# Altium integrated library Samtec_2_mm_Pitch_Socket_Strips.IntLib: 251 symbols (part 1 of 3) (continued)
## MMS-111-02-L-DV-A
designator J?
Tiger Claw(TM) Socket Strip, Surface Mount, Vertical, -55 to 125 degC, 2 mm Pitch, 22-Pin, Female, RoHS; Manufacturer: Samtec; PartNumber: MMS-111-02-L-DV-A; Pitch: 2 mm; DatasheetVersion: F-214; PackageVersion: CI, 4/1994; PackageReference: MMS-111-02-X-DV-A; PackageDescription: 2mm Surface Mount Box Connector Strip ASM; Orientation: Vertical; RoHS: True; Temperature Range: -55 to 125 degC; Mounting Technology: Surface Mount; ComponentLink1Description: Manufacturer URL; ComponentLink1URL: http://www.samtec.com; ComponentLink2Description: Datasheet; ComponentLink2URL: http://www.samtec.com/documents/webfiles/pdf/MMS.PDF; ComponentLink3Description: Package Specification; ComponentLink3URL: http://www.samtec.com/documents/webfiles/cpdf/MMS-1XX-02-XXX-XX-XX-XXX-MKT.pdf
footprint SMTC-MMS-111-02-X-DV-A (Surface Mount Box Connector Strip ASM, 2x11 Pins, Vertical, 2mm Pitch, Female)
pins: 1, 2, 3, 4, 5, 6, 7, 8, 9, 10, 11, 12, 13, 14, 15, 16, 17, 18, 19, 20, 21, 22

## MMS-111-02-L-DV-LC
designator J?
Tiger Claw(TM) Socket Strip, Surface Mount, Vertical, -55 to 125 degC, 2 mm Pitch, 22-Pin, Female, RoHS; Manufacturer: Samtec; PartNumber: MMS-111-02-L-DV-LC; Pitch: 2 mm; DatasheetVersion: F-214; PackageVersion: CI, 4/1994; PackageReference: MMS-111-02-X-DV-LC; PackageDescription: 2mm Surface Mount Box Connector Strip ASM; Orientation: Vertical; RoHS: True; Temperature Range: -55 to 125 degC; Mounting Technology: Surface Mount; ComponentLink1Description: Manufacturer URL; ComponentLink1URL: http://www.samtec.com; ComponentLink2Description: Datasheet; ComponentLink2URL: http://www.samtec.com/documents/webfiles/pdf/MMS.PDF; ComponentLink3Description: Package Specification; ComponentLink3URL: http://www.samtec.com/documents/webfiles/cpdf/MMS-1XX-02-XXX-XX-XX-XXX-MKT.pdf
footprint SMTC-MMS-111-02-X-DV-LC (Surface Mount Box Connector Strip ASM, 2x11 Pins, Vertical, 2mm Pitch, Female)
pins: 1, 2, 3, 4, 5, 6, 7, 8, 9, 10, 11, 12, 13, 14, 15, 16, 17, 18, 19, 20, 21, 22

## MMS-111-02-T-DV-A
designator J?
Tiger Claw(TM) Socket Strip, Surface Mount, Vertical, -55 to 105 degC, 2 mm Pitch, 22-Pin, Female, RoHS; Manufacturer: Samtec; PartNumber: MMS-111-02-T-DV-A; Pitch: 2 mm; DatasheetVersion: F-214; PackageVersion: CI, 4/1994; PackageReference: MMS-111-02-X-DV-A; PackageDescription: 2mm Surface Mount Box Connector Strip ASM; Orientation: Vertical; RoHS: True; Temperature Range: -55 to 105 degC; Mounting Technology: Surface Mount; ComponentLink1Description: Manufacturer URL; ComponentLink1URL: http://www.samtec.com; ComponentLink2Description: Datasheet; ComponentLink2URL: http://www.samtec.com/documents/webfiles/pdf/MMS.PDF; ComponentLink3Description: Package Specification; ComponentLink3URL: http://www.samtec.com/documents/webfiles/cpdf/MMS-1XX-02-XXX-XX-XX-XXX-MKT.pdf
footprint SMTC-MMS-111-02-X-DV-A (Surface Mount Box Connector Strip ASM, 2x11 Pins, Vertical, 2mm Pitch, Female)
pins: 1, 2, 3, 4, 5, 6, 7, 8, 9, 10, 11, 12, 13, 14, 15, 16, 17, 18, 19, 20, 21, 22

## MMS-111-02-T-DV-LC
designator J?
Tiger Claw(TM) Socket Strip, Surface Mount, Vertical, -55 to 105 degC, 2 mm Pitch, 22-Pin, Female, RoHS; Manufacturer: Samtec; PartNumber: MMS-111-02-T-DV-LC; Pitch: 2 mm; DatasheetVersion: F-214; PackageVersion: CI, 4/1994; PackageReference: MMS-111-02-X-DV-LC; PackageDescription: 2mm Surface Mount Box Connector Strip ASM; Orientation: Vertical; RoHS: True; Temperature Range: -55 to 105 degC; Mounting Technology: Surface Mount; ComponentLink1Description: Manufacturer URL; ComponentLink1URL: http://www.samtec.com; ComponentLink2Description: Datasheet; ComponentLink2URL: http://www.samtec.com/documents/webfiles/pdf/MMS.PDF; ComponentLink3Description: Package Specification; ComponentLink3URL: http://www.samtec.com/documents/webfiles/cpdf/MMS-1XX-02-XXX-XX-XX-XXX-MKT.pdf
footprint SMTC-MMS-111-02-X-DV-LC (Surface Mount Box Connector Strip ASM, 2x11 Pins, Vertical, 2mm Pitch, Female)
pins: 1, 2, 3, 4, 5, 6, 7, 8, 9, 10, 11, 12, 13, 14, 15, 16, 17, 18, 19, 20, 21, 22

## MMS-112-02-F-DV-K
designator J?
Tiger Claw(TM) Socket Strip, Surface Mount, Vertical, -55 to 125 degC, 2 mm Pitch, 24-Pin, Female, RoHS; Manufacturer: Samtec; PartNumber: MMS-112-02-F-DV-K; Pitch: 2 mm; DatasheetVersion: F-214; PackageVersion: CI, 4/1994; PackageReference: MMS-112-02-X-DV-K; PackageDescription: 2mm Surface Mount Box Connector Strip ASM; Orientation: Vertical; RoHS: True; Temperature Range: -55 to 125 degC; Mounting Technology: Surface Mount; ComponentLink1Description: Manufacturer URL; ComponentLink1URL: http://www.samtec.com; ComponentLink2Description: Datasheet; ComponentLink2URL: http://www.samtec.com/documents/webfiles/pdf/MMS.PDF; ComponentLink3Description: Package Specification; ComponentLink3URL: http://www.samtec.com/documents/webfiles/cpdf/MMS-1XX-02-XXX-XX-XX-XXX-MKT.pdf
footprint SMTC-MMS-112-02-X-DV-K (Surface Mount Box Connector Strip ASM, 2x12 Pins, Vertical, 2mm Pitch, Female)
pins: 1, 2, 3, 4, 5, 6, 7, 8, 9, 10, 11, 12, 13, 14, 15, 16, 17, 18, 19, 20, 21, 22, 23, 24

## MMS-112-02-L-DV-K
designator J?
Tiger Claw(TM) Socket Strip, Surface Mount, Vertical, -55 to 125 degC, 2 mm Pitch, 24-Pin, Female, RoHS; Manufacturer: Samtec; PartNumber: MMS-112-02-L-DV-K; Pitch: 2 mm; DatasheetVersion: F-214; PackageVersion: CI, 4/1994; PackageReference: MMS-112-02-X-DV-K; PackageDescription: 2mm Surface Mount Box Connector Strip ASM; Orientation: Vertical; RoHS: True; Temperature Range: -55 to 125 degC; Mounting Technology: Surface Mount; ComponentLink1Description: Manufacturer URL; ComponentLink1URL: http://www.samtec.com; ComponentLink2Description: Datasheet; ComponentLink2URL: http://www.samtec.com/documents/webfiles/pdf/MMS.PDF; ComponentLink3Description: Package Specification; ComponentLink3URL: http://www.samtec.com/documents/webfiles/cpdf/MMS-1XX-02-XXX-XX-XX-XXX-MKT.pdf
footprint SMTC-MMS-112-02-X-DV-K (Surface Mount Box Connector Strip ASM, 2x12 Pins, Vertical, 2mm Pitch, Female)
pins: 1, 2, 3, 4, 5, 6, 7, 8, 9, 10, 11, 12, 13, 14, 15, 16, 17, 18, 19, 20, 21, 22, 23, 24

## MMS-112-02-T-DV-K
designator J?
Tiger Claw(TM) Socket Strip, Surface Mount, Vertical, -55 to 105 degC, 2 mm Pitch, 24-Pin, Female, RoHS; Manufacturer: Samtec; PartNumber: MMS-112-02-T-DV-K; Pitch: 2 mm; DatasheetVersion: F-214; PackageVersion: CI, 4/1994; PackageReference: MMS-112-02-X-DV-K; PackageDescription: 2mm Surface Mount Box Connector Strip ASM; Orientation: Vertical; RoHS: True; Temperature Range: -55 to 105 degC; Mounting Technology: Surface Mount; ComponentLink1Description: Manufacturer URL; ComponentLink1URL: http://www.samtec.com; ComponentLink2Description: Datasheet; ComponentLink2URL: http://www.samtec.com/documents/webfiles/pdf/MMS.PDF; ComponentLink3Description: Package Specification; ComponentLink3URL: http://www.samtec.com/documents/webfiles/cpdf/MMS-1XX-02-XXX-XX-XX-XXX-MKT.pdf
footprint SMTC-MMS-112-02-X-DV-K (Surface Mount Box Connector Strip ASM, 2x12 Pins, Vertical, 2mm Pitch, Female)
pins: 1, 2, 3, 4, 5, 6, 7, 8, 9, 10, 11, 12, 13, 14, 15, 16, 17, 18, 19, 20, 21, 22, 23, 24

## MMS-114-01-F-DV-01
designator J?
Tiger Claw(TM) Socket Strip, Through-hole, Vertical, -55 to 125 degC, 2 mm Pitch, 28-Pin, Female, RoHS; Manufacturer: Samtec; PartNumber: MMS-114-01-F-DV-01; Pitch: 2 mm; DatasheetVersion: F-214; PackageVersion: AO, 2/1993; PackageReference: MMS-114-01-X-DV-01; PackageDescription: 2mm Through Hole Box Connector Strip Assembly; Orientation: Vertical; RoHS: True; Temperature Range: -55 to 125 degC; Mounting Technology: Through-hole; ComponentLink1Description: Manufacturer URL; ComponentLink1URL: http://www.samtec.com; ComponentLink2Description: Datasheet; ComponentLink2URL: http://www.samtec.com/documents/webfiles/pdf/MMS.PDF; ComponentLink3Description: Package Specification; ComponentLink3URL: http://www.samtec.com/documents/webfiles/cpdf/MMS-1XX-01-XXX-XX-XXX-MKT1.pdf
footprint SMTC-MMS-114-01-X-DV-01 (Through Hole Box Connector Strip Assembly, 2x14 Pins, Vertical, 2mm Pitch, Female)
pins: 1, 2, 3, 4, 5, 6, 7, 8, 9, 10, 11, 12, 13, 14, 15, 16, 17, 18, 19, 20, 21, 22, 23, 24, 25, 26, 27, 28

## MMS-114-01-L-DV-01
designator J?
Tiger Claw(TM) Socket Strip, Through-hole, Vertical, -55 to 125 degC, 2 mm Pitch, 28-Pin, Female, RoHS; Manufacturer: Samtec; PartNumber: MMS-114-01-L-DV-01; Pitch: 2 mm; DatasheetVersion: F-214; PackageVersion: AO, 2/1993; PackageReference: MMS-114-01-X-DV-01; PackageDescription: 2mm Through Hole Box Connector Strip Assembly; Orientation: Vertical; RoHS: True; Temperature Range: -55 to 125 degC; Mounting Technology: Through-hole; ComponentLink1Description: Manufacturer URL; ComponentLink1URL: http://www.samtec.com; ComponentLink2Description: Datasheet; ComponentLink2URL: http://www.samtec.com/documents/webfiles/pdf/MMS.PDF; ComponentLink3Description: Package Specification; ComponentLink3URL: http://www.samtec.com/documents/webfiles/cpdf/MMS-1XX-01-XXX-XX-XXX-MKT1.pdf
footprint SMTC-MMS-114-01-X-DV-01 (Through Hole Box Connector Strip Assembly, 2x14 Pins, Vertical, 2mm Pitch, Female)
pins: 1, 2, 3, 4, 5, 6, 7, 8, 9, 10, 11, 12, 13, 14, 15, 16, 17, 18, 19, 20, 21, 22, 23, 24, 25, 26, 27, 28

## MMS-114-01-T-DV-01
designator J?
Tiger Claw(TM) Socket Strip, Through-hole, Vertical, -55 to 105 degC, 2 mm Pitch, 28-Pin, Female, RoHS; Manufacturer: Samtec; PartNumber: MMS-114-01-T-DV-01; Pitch: 2 mm; DatasheetVersion: F-214; PackageVersion: AO, 2/1993; PackageReference: MMS-114-01-X-DV-01; PackageDescription: 2mm Through Hole Box Connector Strip Assembly; Orientation: Vertical; RoHS: True; Temperature Range: -55 to 105 degC; Mounting Technology: Through-hole; ComponentLink1Description: Manufacturer URL; ComponentLink1URL: http://www.samtec.com; ComponentLink2Description: Datasheet; ComponentLink2URL: http://www.samtec.com/documents/webfiles/pdf/MMS.PDF; ComponentLink3Description: Package Specification; ComponentLink3URL: http://www.samtec.com/documents/webfiles/cpdf/MMS-1XX-01-XXX-XX-XXX-MKT1.pdf
footprint SMTC-MMS-114-01-X-DV-01 (Through Hole Box Connector Strip Assembly, 2x14 Pins, Vertical, 2mm Pitch, Female)
pins: 1, 2, 3, 4, 5, 6, 7, 8, 9, 10, 11, 12, 13, 14, 15, 16, 17, 18, 19, 20, 21, 22, 23, 24, 25, 26, 27, 28

## MMS-120-02-F-DV-K
designator J?
Tiger Claw(TM) Socket Strip, Surface Mount, Vertical, -55 to 125 degC, 2 mm Pitch, 40-Pin, Female, RoHS; Manufacturer: Samtec; PartNumber: MMS-120-02-F-DV-K; Pitch: 2 mm; DatasheetVersion: F-214; PackageVersion: CI, 4/1994; PackageReference: MMS-120-02-X-DV-K; PackageDescription: 2mm Surface Mount Box Connector Strip ASM; Orientation: Vertical; RoHS: True; Temperature Range: -55 to 125 degC; Mounting Technology: Surface Mount; ComponentLink1Description: Manufacturer URL; ComponentLink1URL: http://www.samtec.com; ComponentLink2Description: Datasheet; ComponentLink2URL: http://www.samtec.com/documents/webfiles/pdf/MMS.PDF; ComponentLink3Description: Package Specification; ComponentLink3URL: http://www.samtec.com/documents/webfiles/cpdf/MMS-1XX-02-XXX-XX-XX-XXX-MKT.pdf
footprint SMTC-MMS-120-02-X-DV-K (Surface Mount Box Connector Strip ASM, 2x20 Pins, Vertical, 2mm Pitch, Female)
pins: 1, 2, 3, 4, 5, 6, 7, 8, 9, 10, 11, 12, 13, 14, 15, 16, 17, 18, 19, 20, 21, 22, 23, 24, 25, 26, 27, 28, 29, 30, 31, 32, 33, 34, 35, 36, 37, 38, 39, 40

## MMS-120-02-F-DV-P
designator J?
Tiger Claw(TM) Socket Strip, Surface Mount, Vertical, -55 to 125 degC, 2 mm Pitch, 40-Pin, Female, RoHS; Manufacturer: Samtec; PartNumber: MMS-120-02-F-DV-P; Pitch: 2 mm; DatasheetVersion: F-214; PackageVersion: CI, 4/1994; PackageReference: MMS-120-02-X-DV-P; PackageDescription: 2mm Surface Mount Box Connector Strip ASM; Orientation: Vertical; RoHS: True; Temperature Range: -55 to 125 degC; Mounting Technology: Surface Mount; ComponentLink1Description: Manufacturer URL; ComponentLink1URL: http://www.samtec.com; ComponentLink2Description: Datasheet; ComponentLink2URL: http://www.samtec.com/documents/webfiles/pdf/MMS.PDF; ComponentLink3Description: Package Specification; ComponentLink3URL: http://www.samtec.com/documents/webfiles/cpdf/MMS-1XX-02-XXX-XX-XX-XXX-MKT.pdf
footprint SMTC-MMS-120-02-X-DV-P (Surface Mount Box Connector Strip ASM, 2x20 Pins, Vertical, 2mm Pitch, Female)
pins: 1, 2, 3, 4, 5, 6, 7, 8, 9, 10, 11, 12, 13, 14, 15, 16, 17, 18, 19, 20, 21, 22, 23, 24, 25, 26, 27, 28, 29, 30, 31, 32, 33, 34, 35, 36, 37, 38, 39, 40

## MMS-120-02-F-SH
designator J?
Tiger Claw(TM) Socket Strip, Surface Mount, Horizontal, -55 to 125 degC, 2 mm Pitch, 40-Pin, Female, RoHS; Manufacturer: Samtec; PartNumber: MMS-120-02-F-SH; Pitch: 2 mm; DatasheetVersion: F-214; PackageVersion: CI, 4/1994; PackageReference: MMS-120-02-X-SH; PackageDescription: 2mm Surface Mount Box Connector Strip ASM; Orientation: Horizontal; RoHS: True; Temperature Range: -55 to 125 degC; Mounting Technology: Surface Mount; ComponentLink1Description: Manufacturer URL; ComponentLink1URL: http://www.samtec.com; ComponentLink2Description: Datasheet; ComponentLink2URL: http://www.samtec.com/documents/webfiles/pdf/MMS.PDF; ComponentLink3Description: Package Specification; ComponentLink3URL: http://www.samtec.com/documents/webfiles/cpdf/MMS-1XX-02-XXX-XX-XX-XXX-MKT.pdf
footprint SMTC-MMS-120-02-X-SH (Surface Mount Box Connector Strip ASM, 2x20 Pins, Horizontal, 2mm Pitch, Female)
pins: 1A, 1B, 2A, 2B, 3A, 3B, 4A, 4B, 5A, 5B, 6A, 6B, 7A, 7B, 8A, 8B, 9A, 9B, 10A, 10B, 11A, 11B, 12A, 12B, 13A, 13B, 14A, 14B, 15A, 15B, 16A, 16B, 17A, 17B, 18A, 18B, 19A, 19B, 20A, 20B

## MMS-120-02-L-DV-K
designator J?
Tiger Claw(TM) Socket Strip, Surface Mount, Vertical, -55 to 125 degC, 2 mm Pitch, 40-Pin, Female, RoHS; Manufacturer: Samtec; PartNumber: MMS-120-02-L-DV-K; Pitch: 2 mm; DatasheetVersion: F-214; PackageVersion: CI, 4/1994; PackageReference: MMS-120-02-X-DV-K; PackageDescription: 2mm Surface Mount Box Connector Strip ASM; Orientation: Vertical; RoHS: True; Temperature Range: -55 to 125 degC; Mounting Technology: Surface Mount; ComponentLink1Description: Manufacturer URL; ComponentLink1URL: http://www.samtec.com; ComponentLink2Description: Datasheet; ComponentLink2URL: http://www.samtec.com/documents/webfiles/pdf/MMS.PDF; ComponentLink3Description: Package Specification; ComponentLink3URL: http://www.samtec.com/documents/webfiles/cpdf/MMS-1XX-02-XXX-XX-XX-XXX-MKT.pdf
footprint SMTC-MMS-120-02-X-DV-K (Surface Mount Box Connector Strip ASM, 2x20 Pins, Vertical, 2mm Pitch, Female)
pins: 1, 2, 3, 4, 5, 6, 7, 8, 9, 10, 11, 12, 13, 14, 15, 16, 17, 18, 19, 20, 21, 22, 23, 24, 25, 26, 27, 28, 29, 30, 31, 32, 33, 34, 35, 36, 37, 38, 39, 40

## MMS-120-02-L-DV-P
designator J?
Tiger Claw(TM) Socket Strip, Surface Mount, Vertical, -55 to 125 degC, 2 mm Pitch, 40-Pin, Female, RoHS; Manufacturer: Samtec; PartNumber: MMS-120-02-L-DV-P; Pitch: 2 mm; DatasheetVersion: F-214; PackageVersion: CI, 4/1994; PackageReference: MMS-120-02-X-DV-P; PackageDescription: 2mm Surface Mount Box Connector Strip ASM; Orientation: Vertical; RoHS: True; Temperature Range: -55 to 125 degC; Mounting Technology: Surface Mount; ComponentLink1Description: Manufacturer URL; ComponentLink1URL: http://www.samtec.com; ComponentLink2Description: Datasheet; ComponentLink2URL: http://www.samtec.com/documents/webfiles/pdf/MMS.PDF; ComponentLink3Description: Package Specification; ComponentLink3URL: http://www.samtec.com/documents/webfiles/cpdf/MMS-1XX-02-XXX-XX-XX-XXX-MKT.pdf
footprint SMTC-MMS-120-02-X-DV-P (Surface Mount Box Connector Strip ASM, 2x20 Pins, Vertical, 2mm Pitch, Female)
pins: 1, 2, 3, 4, 5, 6, 7, 8, 9, 10, 11, 12, 13, 14, 15, 16, 17, 18, 19, 20, 21, 22, 23, 24, 25, 26, 27, 28, 29, 30, 31, 32, 33, 34, 35, 36, 37, 38, 39, 40

## MMS-120-02-L-SH
designator J?
Tiger Claw(TM) Socket Strip, Surface Mount, Horizontal, -55 to 125 degC, 2 mm Pitch, 40-Pin, Female, RoHS; Manufacturer: Samtec; PartNumber: MMS-120-02-L-SH; Pitch: 2 mm; DatasheetVersion: F-214; PackageVersion: CI, 4/1994; PackageReference: MMS-120-02-X-SH; PackageDescription: 2mm Surface Mount Box Connector Strip ASM; Supplier 1: Digi-Key; Supplier Part Number 1: SAM1237-20-ND; Supplier 2: Newark; Supplier Part Number 2: 11P5552; Orientation: Horizontal; RoHS: True; Temperature Range: -55 to 125 degC; Mounting Technology: Surface Mount; ComponentLink1Description: Manufacturer URL; ComponentLink1URL: http://www.samtec.com; ComponentLink2Description: Datasheet; ComponentLink2URL: http://www.samtec.com/documents/webfiles/pdf/MMS.PDF; ComponentLink3Description: Package Specification; ComponentLink3URL: http://www.samtec.com/documents/webfiles/cpdf/MMS-1XX-02-XXX-XX-XX-XXX-MKT.pdf
footprint SMTC-MMS-120-02-X-SH (Surface Mount Box Connector Strip ASM, 2x20 Pins, Horizontal, 2mm Pitch, Female)
pins: 1A, 1B, 2A, 2B, 3A, 3B, 4A, 4B, 5A, 5B, 6A, 6B, 7A, 7B, 8A, 8B, 9A, 9B, 10A, 10B, 11A, 11B, 12A, 12B, 13A, 13B, 14A, 14B, 15A, 15B, 16A, 16B, 17A, 17B, 18A, 18B, 19A, 19B, 20A, 20B

## MMS-120-02-T-DV-K
designator J?
Tiger Claw(TM) Socket Strip, Surface Mount, Vertical, -55 to 105 degC, 2 mm Pitch, 40-Pin, Female, RoHS; Manufacturer: Samtec; PartNumber: MMS-120-02-T-DV-K; Pitch: 2 mm; DatasheetVersion: F-214; PackageVersion: CI, 4/1994; PackageReference: MMS-120-02-X-DV-K; PackageDescription: 2mm Surface Mount Box Connector Strip ASM; Orientation: Vertical; RoHS: True; Temperature Range: -55 to 105 degC; Mounting Technology: Surface Mount; ComponentLink1Description: Manufacturer URL; ComponentLink1URL: http://www.samtec.com; ComponentLink2Description: Datasheet; ComponentLink2URL: http://www.samtec.com/documents/webfiles/pdf/MMS.PDF; ComponentLink3Description: Package Specification; ComponentLink3URL: http://www.samtec.com/documents/webfiles/cpdf/MMS-1XX-02-XXX-XX-XX-XXX-MKT.pdf
footprint SMTC-MMS-120-02-X-DV-K (Surface Mount Box Connector Strip ASM, 2x20 Pins, Vertical, 2mm Pitch, Female)
pins: 1, 2, 3, 4, 5, 6, 7, 8, 9, 10, 11, 12, 13, 14, 15, 16, 17, 18, 19, 20, 21, 22, 23, 24, 25, 26, 27, 28, 29, 30, 31, 32, 33, 34, 35, 36, 37, 38, 39, 40

## MMS-120-02-T-DV-P
designator J?
Tiger Claw(TM) Socket Strip, Surface Mount, Vertical, -55 to 105 degC, 2 mm Pitch, 40-Pin, Female, RoHS; Manufacturer: Samtec; PartNumber: MMS-120-02-T-DV-P; Pitch: 2 mm; DatasheetVersion: F-214; PackageVersion: CI, 4/1994; PackageReference: MMS-120-02-X-DV-P; PackageDescription: 2mm Surface Mount Box Connector Strip ASM; Orientation: Vertical; RoHS: True; Temperature Range: -55 to 105 degC; Mounting Technology: Surface Mount; ComponentLink1Description: Manufacturer URL; ComponentLink1URL: http://www.samtec.com; ComponentLink2Description: Datasheet; ComponentLink2URL: http://www.samtec.com/documents/webfiles/pdf/MMS.PDF; ComponentLink3Description: Package Specification; ComponentLink3URL: http://www.samtec.com/documents/webfiles/cpdf/MMS-1XX-02-XXX-XX-XX-XXX-MKT.pdf
footprint SMTC-MMS-120-02-X-DV-P (Surface Mount Box Connector Strip ASM, 2x20 Pins, Vertical, 2mm Pitch, Female)
pins: 1, 2, 3, 4, 5, 6, 7, 8, 9, 10, 11, 12, 13, 14, 15, 16, 17, 18, 19, 20, 21, 22, 23, 24, 25, 26, 27, 28, 29, 30, 31, 32, 33, 34, 35, 36, 37, 38, 39, 40

## MMS-120-02-T-SH
designator J?
Tiger Claw(TM) Socket Strip, Surface Mount, Horizontal, -55 to 105 degC, 2 mm Pitch, 40-Pin, Female, RoHS; Manufacturer: Samtec; PartNumber: MMS-120-02-T-SH; Pitch: 2 mm; DatasheetVersion: F-214; PackageVersion: CI, 4/1994; PackageReference: MMS-120-02-X-SH; PackageDescription: 2mm Surface Mount Box Connector Strip ASM; Supplier 1: Digi-Key; Supplier Part Number 1: SAM1241-20-ND; Orientation: Horizontal; RoHS: True; Temperature Range: -55 to 105 degC; Mounting Technology: Surface Mount; ComponentLink1Description: Manufacturer URL; ComponentLink1URL: http://www.samtec.com; ComponentLink2Description: Datasheet; ComponentLink2URL: http://www.samtec.com/documents/webfiles/pdf/MMS.PDF; ComponentLink3Description: Package Specification; ComponentLink3URL: http://www.samtec.com/documents/webfiles/cpdf/MMS-1XX-02-XXX-XX-XX-XXX-MKT.pdf
footprint SMTC-MMS-120-02-X-SH (Surface Mount Box Connector Strip ASM, 2x20 Pins, Horizontal, 2mm Pitch, Female)
pins: 1A, 1B, 2A, 2B, 3A, 3B, 4A, 4B, 5A, 5B, 6A, 6B, 7A, 7B, 8A, 8B, 9A, 9B, 10A, 10B, 11A, 11B, 12A, 12B, 13A, 13B, 14A, 14B, 15A, 15B, 16A, 16B, 17A, 17B, 18A, 18B, 19A, 19B, 20A, 20B

## MMS-130-02-F-DV-A
designator J?
Tiger Claw(TM) Socket Strip, Surface Mount, Vertical, -55 to 125 degC, 2 mm Pitch, 60-Pin, Female, RoHS; Manufacturer: Samtec; PartNumber: MMS-130-02-F-DV-A; Pitch: 2 mm; DatasheetVersion: F-214; PackageVersion: CI, 4/1994; PackageReference: MMS-130-02-X-DV-A; PackageDescription: 2mm Surface Mount Box Connector Strip ASM; Orientation: Vertical; RoHS: True; Temperature Range: -55 to 125 degC; Mounting Technology: Surface Mount; ComponentLink1Description: Manufacturer URL; ComponentLink1URL: http://www.samtec.com; ComponentLink2Description: Datasheet; ComponentLink2URL: http://www.samtec.com/documents/webfiles/pdf/MMS.PDF; ComponentLink3Description: Package Specification; ComponentLink3URL: http://www.samtec.com/documents/webfiles/cpdf/MMS-1XX-02-XXX-XX-XX-XXX-MKT.pdf
footprint SMTC-MMS-130-02-X-DV-A (Surface Mount Box Connector Strip ASM, 2x30 Pins, Vertical, 2mm Pitch, Female)
pins: 1, 2, 3, 4, 5, 6, 7, 8, 9, 10, 11, 12, 13, 14, 15, 16, 17, 18, 19, 20, 21, 22, 23, 24, 25, 26, 27, 28, 29, 30, 31, 32, 33, 34, 35, 36, 37, 38, 39, 40, 41, 42, 43, 44, 45, 46, 47, 48, 49, 50, 51, 52, 53, 54, 55, 56, 57, 58, 59, 60

## MMS-130-02-L-DV-A
designator J?
Tiger Claw(TM) Socket Strip, Surface Mount, Vertical, -55 to 125 degC, 2 mm Pitch, 60-Pin, Female, RoHS; Manufacturer: Samtec; PartNumber: MMS-130-02-L-DV-A; Pitch: 2 mm; DatasheetVersion: F-214; PackageVersion: CI, 4/1994; PackageReference: MMS-130-02-X-DV-A; PackageDescription: 2mm Surface Mount Box Connector Strip ASM; Orientation: Vertical; RoHS: True; Temperature Range: -55 to 125 degC; Mounting Technology: Surface Mount; ComponentLink1Description: Manufacturer URL; ComponentLink1URL: http://www.samtec.com; ComponentLink2Description: Datasheet; ComponentLink2URL: http://www.samtec.com/documents/webfiles/pdf/MMS.PDF; ComponentLink3Description: Package Specification; ComponentLink3URL: http://www.samtec.com/documents/webfiles/cpdf/MMS-1XX-02-XXX-XX-XX-XXX-MKT.pdf
footprint SMTC-MMS-130-02-X-DV-A (Surface Mount Box Connector Strip ASM, 2x30 Pins, Vertical, 2mm Pitch, Female)
pins: 1, 2, 3, 4, 5, 6, 7, 8, 9, 10, 11, 12, 13, 14, 15, 16, 17, 18, 19, 20, 21, 22, 23, 24, 25, 26, 27, 28, 29, 30, 31, 32, 33, 34, 35, 36, 37, 38, 39, 40, 41, 42, 43, 44, 45, 46, 47, 48, 49, 50, 51, 52, 53, 54, 55, 56, 57, 58, 59, 60

## MMS-130-02-T-DV-A
designator J?
Tiger Claw(TM) Socket Strip, Surface Mount, Vertical, -55 to 105 degC, 2 mm Pitch, 60-Pin, Female, RoHS; Manufacturer: Samtec; PartNumber: MMS-130-02-T-DV-A; Pitch: 2 mm; DatasheetVersion: F-214; PackageVersion: CI, 4/1994; PackageReference: MMS-130-02-X-DV-A; PackageDescription: 2mm Surface Mount Box Connector Strip ASM; Orientation: Vertical; RoHS: True; Temperature Range: -55 to 105 degC; Mounting Technology: Surface Mount; ComponentLink1Description: Manufacturer URL; ComponentLink1URL: http://www.samtec.com; ComponentLink2Description: Datasheet; ComponentLink2URL: http://www.samtec.com/documents/webfiles/pdf/MMS.PDF; ComponentLink3Description: Package Specification; ComponentLink3URL: http://www.samtec.com/documents/webfiles/cpdf/MMS-1XX-02-XXX-XX-XX-XXX-MKT.pdf
footprint SMTC-MMS-130-02-X-DV-A (Surface Mount Box Connector Strip ASM, 2x30 Pins, Vertical, 2mm Pitch, Female)
pins: 1, 2, 3, 4, 5, 6, 7, 8, 9, 10, 11, 12, 13, 14, 15, 16, 17, 18, 19, 20, 21, 22, 23, 24, 25, 26, 27, 28, 29, 30, 31, 32, 33, 34, 35, 36, 37, 38, 39, 40, 41, 42, 43, 44, 45, 46, 47, 48, 49, 50, 51, 52, 53, 54, 55, 56, 57, 58, 59, 60

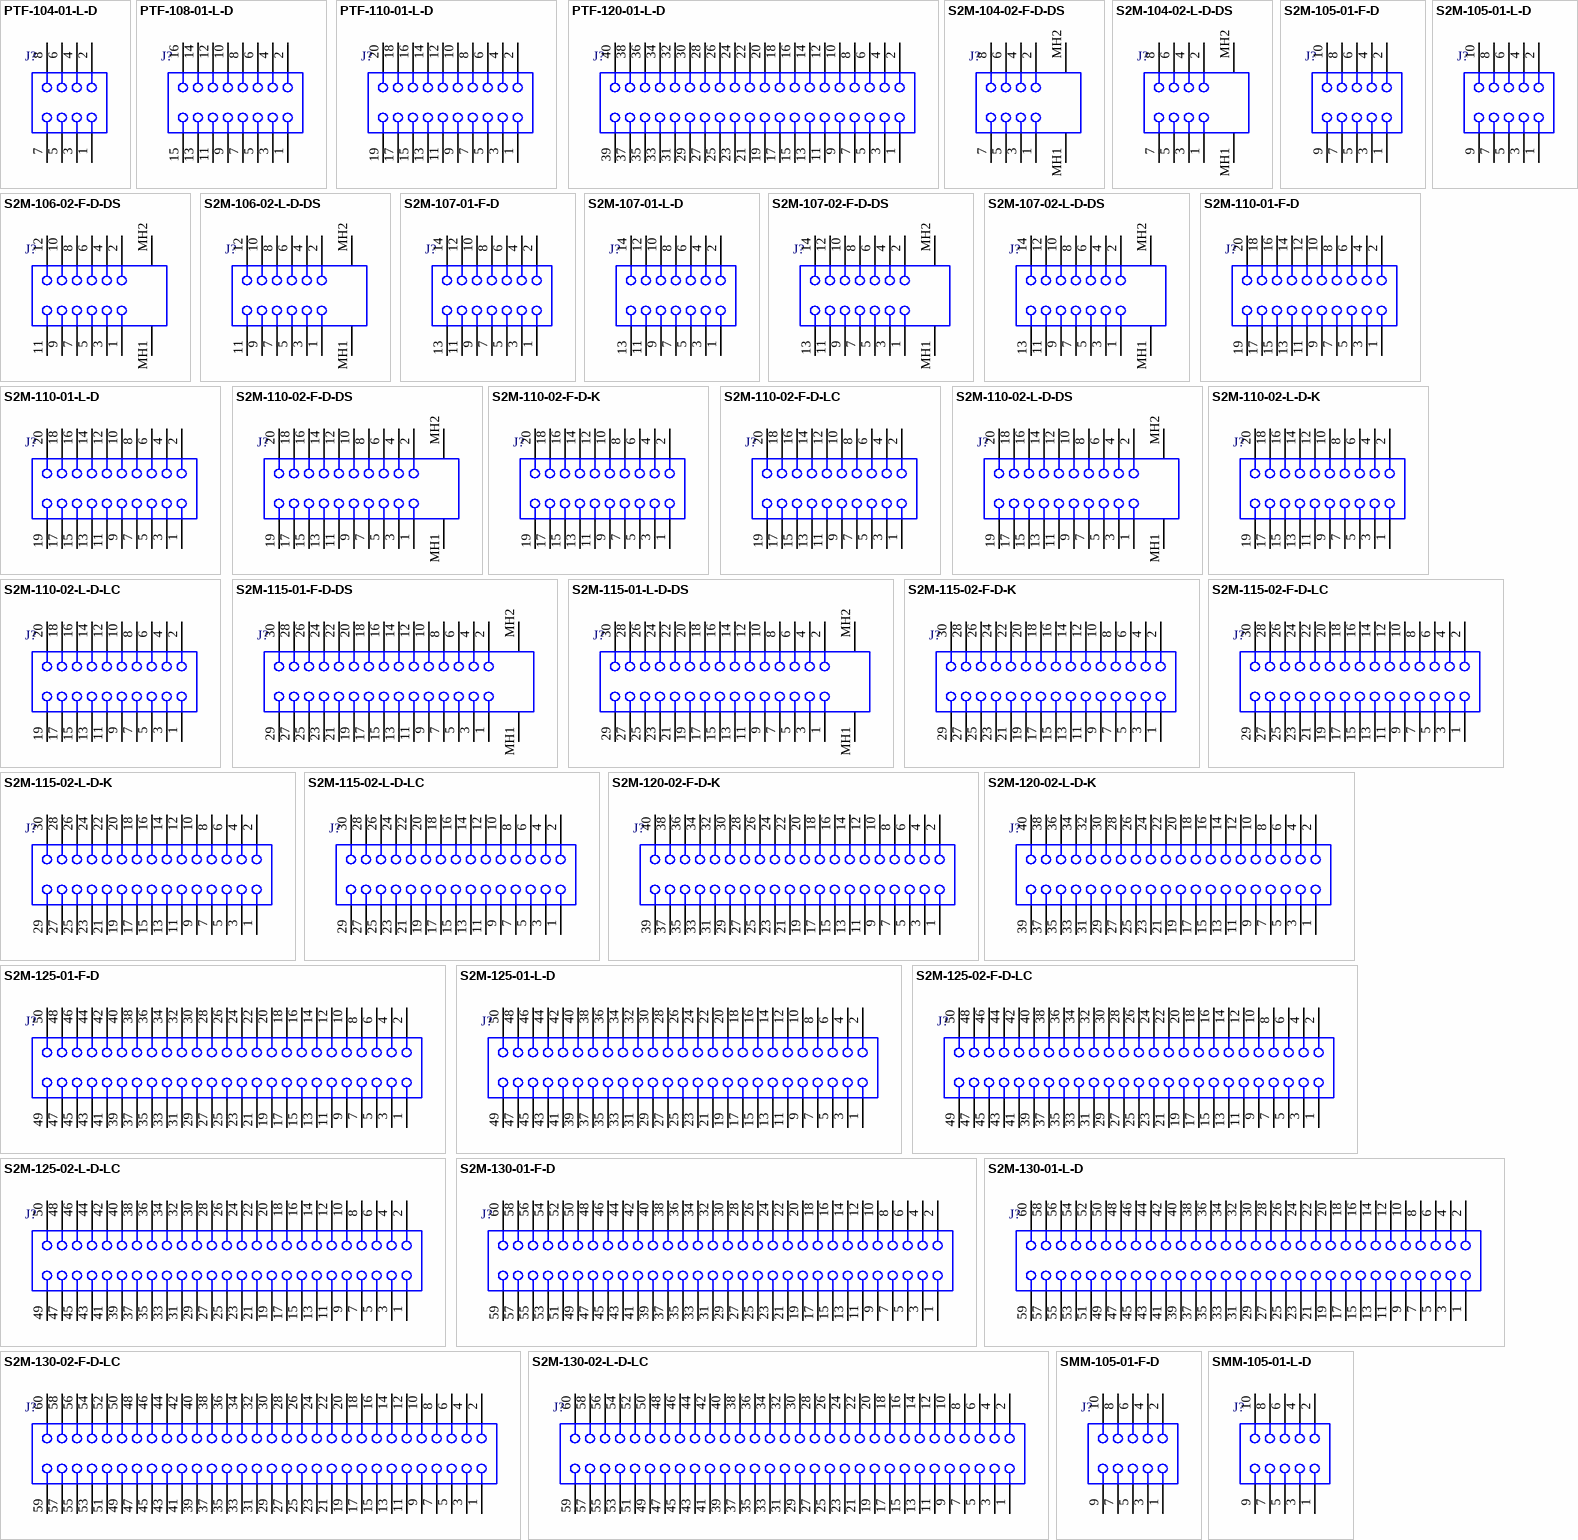
[diagram p3: symbols PTF-104-01-L-D to SMM-105-01-L-D]

## PTF-104-01-L-D
designator J?
Press Fit Socket, Through-hole, Vertical, -55 to 125 degC, 2 mm Pitch, 8-Pin, Female, RoHS; Manufacturer: Samtec; PartNumber: PTF-104-01-L-D; Pitch: 2 mm; DatasheetVersion: F-214; PackageVersion: H, 4/2000; PackageReference: PTF-104-01-X-D; PackageDescription: 2mm Press Fit Socket Assembly; Orientation: Vertical; RoHS: True; Temperature Range: -55 to 125 degC; Mounting Technology: Through-hole; ComponentLink1Description: Manufacturer URL; ComponentLink1URL: http://www.samtec.com; ComponentLink2Description: Datasheet; ComponentLink2URL: http://www.samtec.com/documents/webfiles/pdf/PTF.PDF; ComponentLink3Description: Package Specification; ComponentLink3URL: http://www.samtec.com/documents/webfiles/cpdf/PTF-1XX-XX-X-D-XXX-MKT.pdf
footprint SMTC-PTF-104-01-X-D (Press Fit Socket Assembly, 2x4 Pins, Vertical, 2mm Pitch, Female)
pins: 1, 2, 3, 4, 5, 6, 7, 8

## PTF-108-01-L-D
designator J?
Press Fit Socket, Through-hole, Vertical, -55 to 125 degC, 2 mm Pitch, 16-Pin, Female, RoHS; Manufacturer: Samtec; PartNumber: PTF-108-01-L-D; Pitch: 2 mm; DatasheetVersion: F-214; PackageVersion: H, 4/2000; PackageReference: PTF-108-01-X-D; PackageDescription: 2mm Press Fit Socket Assembly; Orientation: Vertical; RoHS: True; Temperature Range: -55 to 125 degC; Mounting Technology: Through-hole; ComponentLink1Description: Manufacturer URL; ComponentLink1URL: http://www.samtec.com; ComponentLink2Description: Datasheet; ComponentLink2URL: http://www.samtec.com/documents/webfiles/pdf/PTF.PDF; ComponentLink3Description: Package Specification; ComponentLink3URL: http://www.samtec.com/documents/webfiles/cpdf/PTF-1XX-XX-X-D-XXX-MKT.pdf
footprint SMTC-PTF-108-01-X-D (Press Fit Socket Assembly, 2x10 Pins, Vertical, 2mm Pitch, Female)
pins: 1, 2, 3, 4, 5, 6, 7, 8, 9, 10, 11, 12, 13, 14, 15, 16

## PTF-110-01-L-D
designator J?
Press Fit Socket, Through-hole, Vertical, -55 to 125 degC, 2 mm Pitch, 20-Pin, Female, RoHS; Manufacturer: Samtec; PartNumber: PTF-110-01-L-D; Pitch: 2 mm; DatasheetVersion: F-214; PackageVersion: H, 4/2000; PackageReference: PTF-110-01-X-D; PackageDescription: 2mm Press Fit Socket Assembly; Orientation: Vertical; RoHS: True; Temperature Range: -55 to 125 degC; Mounting Technology: Through-hole; ComponentLink1Description: Manufacturer URL; ComponentLink1URL: http://www.samtec.com; ComponentLink2Description: Datasheet; ComponentLink2URL: http://www.samtec.com/documents/webfiles/pdf/PTF.PDF; ComponentLink3Description: Package Specification; ComponentLink3URL: http://www.samtec.com/documents/webfiles/cpdf/PTF-1XX-XX-X-D-XXX-MKT.pdf
footprint SMTC-PTF-110-01-X-D (Press Fit Socket Assembly, 2x20 Pins, Vertical, 2mm Pitch, Female)
pins: 1, 2, 3, 4, 5, 6, 7, 8, 9, 10, 11, 12, 13, 14, 15, 16, 17, 18, 19, 20

## PTF-120-01-L-D
designator J?
Press Fit Socket, Through-hole, Vertical, -55 to 125 degC, 2 mm Pitch, 40-Pin, Female, RoHS; Manufacturer: Samtec; PartNumber: PTF-120-01-L-D; Pitch: 2 mm; DatasheetVersion: F-214; PackageVersion: H, 4/2000; PackageReference: PTF-120-01-X-D; PackageDescription: 2mm Press Fit Socket Assembly; Orientation: Vertical; RoHS: True; Temperature Range: -55 to 125 degC; Mounting Technology: Through-hole; ComponentLink1Description: Manufacturer URL; ComponentLink1URL: http://www.samtec.com; ComponentLink2Description: Datasheet; ComponentLink2URL: http://www.samtec.com/documents/webfiles/pdf/PTF.PDF; ComponentLink3Description: Package Specification; ComponentLink3URL: http://www.samtec.com/documents/webfiles/cpdf/PTF-1XX-XX-X-D-XXX-MKT.pdf
footprint SMTC-PTF-120-01-X-D (Press Fit Socket Assembly, 2x8 Pins, Vertical, 2mm Pitch, Female)
pins: 1, 2, 3, 4, 5, 6, 7, 8, 9, 10, 11, 12, 13, 14, 15, 16, 17, 18, 19, 20, 21, 22, 23, 24, 25, 26, 27, 28, 29, 30, 31, 32, 33, 34, 35, 36, 37, 38, 39, 40

## S2M-104-02-F-D-DS
designator J?
High Reliability Cable Socket, Surface Mount, Vertical, -55 to 125 degC, 2 mm Pitch, 8-Pin, Female, RoHS; Manufacturer: Samtec; PartNumber: S2M-104-02-F-D-DS; Pitch: 2 mm; DatasheetVersion: F-214; PackageVersion: M, 9/2010; PackageReference: S2M-104-02-X-D-DS; PackageDescription: 2 mm Double Row Socket Strip; Orientation: Vertical; RoHS: True; Temperature Range: -55 to 125 degC; Mounting Technology: Surface Mount; ComponentLink1Description: Manufacturer URL; ComponentLink1URL: http://www.samtec.com; ComponentLink2Description: Datasheet; ComponentLink2URL: http://www.samtec.com/documents/webfiles/pdf/s2m.pdf; ComponentLink3Description: Package Specification; ComponentLink3URL: http://www.samtec.com/documents/webfiles/cpdf/S2M-1XX-XX-X-D-XX-XX-MKT.pdf
footprint SMTC-S2M-104-02-X-D-DS (Socket Strip, 2x4 Pins, Vertical, 2mm Pitch, Female)
pins: 1, 2, 3, 4, 5, 6, 7, 8, MH1, MH2

## S2M-104-02-L-D-DS
designator J?
High Reliability Cable Socket, Surface Mount, Vertical, -55 to 125 degC, 2 mm Pitch, 8-Pin, Female, RoHS; Manufacturer: Samtec; PartNumber: S2M-104-02-L-D-DS; Pitch: 2 mm; DatasheetVersion: F-214; PackageVersion: M, 9/2010; PackageReference: S2M-104-02-X-D-DS; PackageDescription: 2 mm Double Row Socket Strip; Orientation: Vertical; RoHS: True; Temperature Range: -55 to 125 degC; Mounting Technology: Surface Mount; ComponentLink1Description: Manufacturer URL; ComponentLink1URL: http://www.samtec.com; ComponentLink2Description: Datasheet; ComponentLink2URL: http://www.samtec.com/documents/webfiles/pdf/s2m.pdf; ComponentLink3Description: Package Specification; ComponentLink3URL: http://www.samtec.com/documents/webfiles/cpdf/S2M-1XX-XX-X-D-XX-XX-MKT.pdf
footprint SMTC-S2M-104-02-X-D-DS (Socket Strip, 2x4 Pins, Vertical, 2mm Pitch, Female)
pins: 1, 2, 3, 4, 5, 6, 7, 8, MH1, MH2

## S2M-105-01-F-D
designator J?
High Reliability Cable Socket, Through-hole, Vertical, -55 to 125 degC, 2 mm Pitch, 10-Pin, Female, RoHS; Manufacturer: Samtec; PartNumber: S2M-105-01-F-D; Pitch: 2 mm; DatasheetVersion: F-214; PackageVersion: M, 9/2010; PackageReference: S2M-105-01-X-D; PackageDescription: 2 mm Double Row Socket Strip; Orientation: Vertical; RoHS: True; Temperature Range: -55 to 125 degC; Mounting Technology: Through-hole; ComponentLink1Description: Manufacturer URL; ComponentLink1URL: http://www.samtec.com; ComponentLink2Description: Datasheet; ComponentLink2URL: http://www.samtec.com/documents/webfiles/pdf/s2m.pdf; ComponentLink3Description: Package Specification; ComponentLink3URL: http://www.samtec.com/documents/webfiles/cpdf/S2M-1XX-XX-X-D-XX-XX-MKT.pdf
footprint SMTC-S2M-105-01-X-D (Socket Strip, 2x5 Pins, Vertical, 2mm Pitch, Female)
pins: 1, 2, 3, 4, 5, 6, 7, 8, 9, 10

## S2M-105-01-L-D
designator J?
High Reliability Cable Socket, Through-hole, Vertical, -55 to 125 degC, 2 mm Pitch, 10-Pin, Female, RoHS; Manufacturer: Samtec; PartNumber: S2M-105-01-L-D; Pitch: 2 mm; DatasheetVersion: F-214; PackageVersion: M, 9/2010; PackageReference: S2M-105-01-X-D; PackageDescription: 2 mm Double Row Socket Strip; Supplier 1: Farnell; Supplier Part Number 1: 2085238; Orientation: Vertical; RoHS: True; Temperature Range: -55 to 125 degC; Mounting Technology: Through-hole; ComponentLink1Description: Manufacturer URL; ComponentLink1URL: http://www.samtec.com; ComponentLink2Description: Datasheet; ComponentLink2URL: http://www.samtec.com/documents/webfiles/pdf/s2m.pdf; ComponentLink3Description: Package Specification; ComponentLink3URL: http://www.samtec.com/documents/webfiles/cpdf/S2M-1XX-XX-X-D-XX-XX-MKT.pdf
footprint SMTC-S2M-105-01-X-D (Socket Strip, 2x5 Pins, Vertical, 2mm Pitch, Female)
pins: 1, 2, 3, 4, 5, 6, 7, 8, 9, 10

## S2M-106-02-F-D-DS
designator J?
High Reliability Cable Socket, Surface Mount, Vertical, -55 to 125 degC, 2 mm Pitch, 12-Pin, Female, RoHS; Manufacturer: Samtec; PartNumber: S2M-106-02-F-D-DS; Pitch: 2 mm; DatasheetVersion: F-214; PackageVersion: M, 9/2010; PackageReference: S2M-106-02-X-D-DS; PackageDescription: 2 mm Double Row Socket Strip; Orientation: Vertical; RoHS: True; Temperature Range: -55 to 125 degC; Mounting Technology: Surface Mount; ComponentLink1Description: Manufacturer URL; ComponentLink1URL: http://www.samtec.com; ComponentLink2Description: Datasheet; ComponentLink2URL: http://www.samtec.com/documents/webfiles/pdf/s2m.pdf; ComponentLink3Description: Package Specification; ComponentLink3URL: http://www.samtec.com/documents/webfiles/cpdf/S2M-1XX-XX-X-D-XX-XX-MKT.pdf
footprint SMTC-S2M-106-02-X-D-DS (Socket Strip, 2x6 Pins, Vertical, 2mm Pitch, Female)
pins: 1, 2, 3, 4, 5, 6, 7, 8, 9, 10, 11, 12, MH1, MH2